# Altium footprint library CeleronLib_THD.PcbLib: 217 footprints (part 1 of 14)
Each footprint in its own frame and in the unit in brackets; x right, y up, seen from the top. Pads: shape width x height; smd on the part's side, far side on the other; paste and mask are expansions set on the pad; w line width, h text height; cw(c..) or ccw(c..) is an arc to the next point about the centre after c.
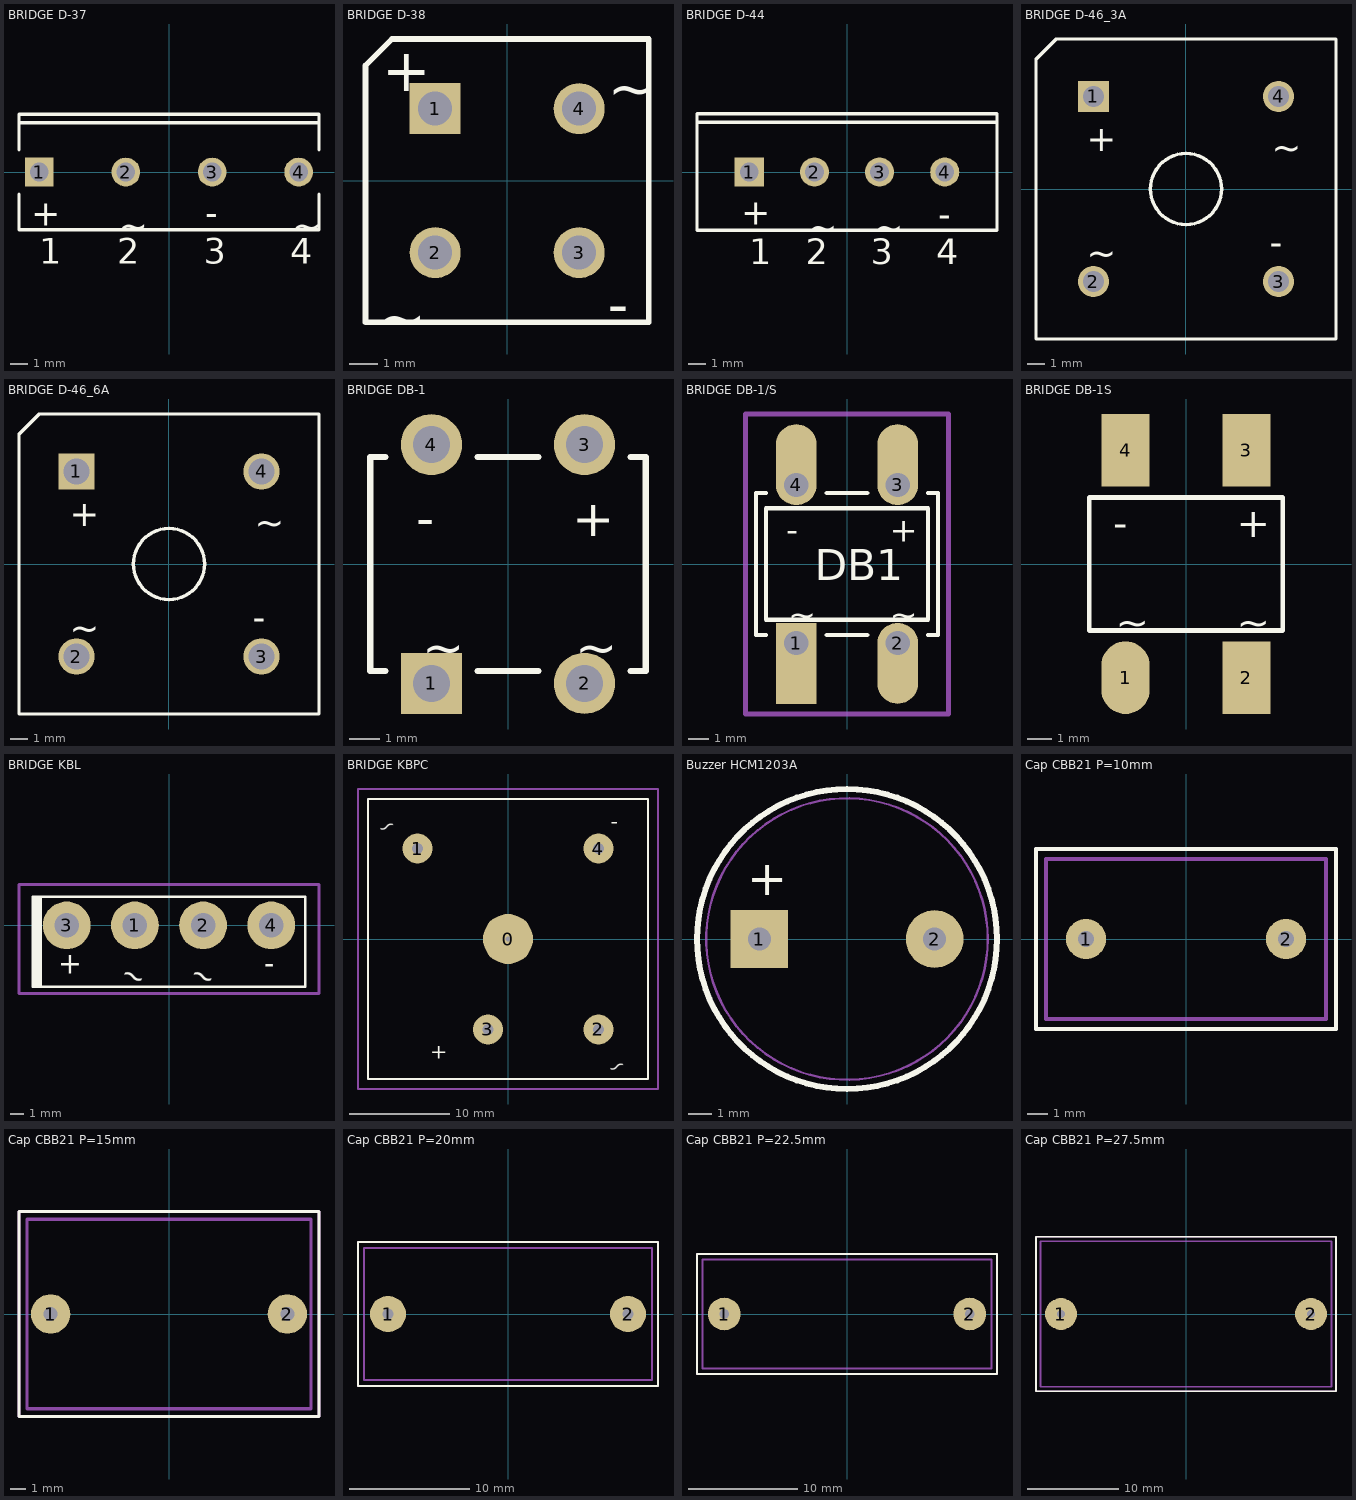
[diagram p0: the footprints below, top view; thin cyan lines are the x and y axes]

## BRIDGE D-37 [mm] "SIP; 4 Leads; Body 15 x 17.5 x 6.8 mm (typ); Pitch 5.1 mm"
height 15
pads (4):
  rect 1.7x1.7 hole 1.1: 1(-7.65,0)
  round 1.7 hole 1.1: 2(-2.55,0) 3(2.55,0) 4(7.65,0)
Top Overlay:
  lines w0.2: -8.85,-1.3 -8.85,-3.4 8.85,-3.4 8.85,-1.3 ; -8.85,1.3 -8.85,3.4 8.85,3.4 8.85,1.3 ; -8.85,2.9 8.85,2.9
  text "~" at 7.27,-3.9 h1.5
  text "~" at -2.97,-3.9 h1.5
  text "+" at -8.14,-3.16 h1.5
  text "-" at 2.13,-3.15 h1.5
  text "4" at 7.142,-5.4 h1.5
  text "3" at 2.042,-5.4 h1.5
  text "2" at -3.058,-5.4 h1.5
  text "1" at -7.65,-5.4 h1.5

## BRIDGE D-38 [mm] "Bridge Rectifier; 4 Terminals; Body 9.4 x 9.4 mm (typ); Pitch 5.08 mm"
height 9.91
pads (4):
  rect 1.8x1.8 hole 1.2: 1(-2.54,2.54)
  round 1.8 hole 1.2: 2(-2.54,-2.54) 3(2.54,-2.54) 4(2.54,2.54)
Top Overlay:
  lines w0.2: -5,-5 -5,4.064 -4.064,5 5,5 5,-5 -5,-5
  text "+" at -4.41,3.164 h1.5
  text "-" at 3.556,-5.08 h1.5
  text "~" at -4.572,-5.588 h1.5
  text "~" at 3.556,2.54 h1.5

## BRIDGE D-44 [mm] "SIP; 4 Leads; Body 15 x 17.5 x 6.8 mm (typ); Pitch 3.8 mm"
height 15
pads (4):
  rect 1.7x1.7 hole 1.1: 1(-5.7,0)
  round 1.7 hole 1.1: 2(-1.9,0) 3(1.9,0) 4(5.7,0)
Top Overlay:
  lines w0.2: -8.75,2.9 8.75,2.9 ; -8.75,-3.4 -8.75,3.4 8.75,3.4 8.75,-3.4 -8.75,-3.4
  text "4" at 5.192,-5.38 h1.5
  text "3" at 1.392,-5.38 h1.5
  text "2" at -2.408,-5.38 h1.5
  text "1" at -5.7,-5.38 h1.5
  text "~" at -2.27,-3.94 h1.5
  text "~" at 1.6,-3.94 h1.5
  text "+" at -6.18,-3.08 h1.5
  text "-" at 5.32,-3.19 h1.5

## BRIDGE D-46_3A [mm] "Bridge Rectifier; 4 Terminals; Body 16.8 x 16.8 mm (typ); Pitch 10.67 mm"
height 6.35
pads (4):
  rect 1.8x1.8 hole 1.2: 1(-5.335,5.335)
  round 1.8 hole 1.2: 2(-5.335,-5.335) 3(5.335,-5.335) 4(5.335,5.335)
Top Overlay:
  circle w0.2: c0,0 r2.05
  lines w0.2: -8.65,-8.65 -8.65,7.474 -7.474,8.65 8.65,8.65 8.65,-8.65 -8.65,-8.65
  text "+" at -5.723,2.167 h1.5
  text "-" at 4.825,-3.809 h1.5
  text "~" at 4.945,1.659 h1.5
  text "~" at -5.723,-4.437 h1.5

## BRIDGE D-46_6A [mm] "Bridge Rectifier; 4 Terminals; Body 16.8 x 16.8 mm (typ); Pitch 10.67 mm"
height 6.35
pads (4):
  rect 2.1x2.1 hole 1.5: 1(-5.335,5.335)
  round 2.1 hole 1.5: 2(-5.335,-5.335) 3(5.335,-5.335) 4(5.335,5.335)
Top Overlay:
  circle w0.2: c0,0 r2.05
  lines w0.2: -8.65,-8.65 8.65,-8.65 8.65,8.65 -7.474,8.65 -8.65,7.474 -8.65,-8.65
  text "~" at -5.723,-4.437 h1.5
  text "~" at 4.945,1.659 h1.5
  text "-" at 4.825,-3.809 h1.5
  text "+" at -5.723,2.167 h1.5

## BRIDGE DB-1 [mm] "Диодный мост, Diode Bridge 1A, 1000V"
height 5.5
pads (4):
  rect 2x2 hole 1.2: 1(-2.5,-3.9)
  round 2 hole 1.2: 2(2.5,-3.9) 3(2.5,3.9) 4(-2.5,3.9)
Top Overlay:
  lines w0.2: -4,-3.5 -4.5,-3.5 -4.5,3.5 -4,3.5 ; -1,-3.5 1,-3.5 ; -1,3.5 1,3.5 ; 4,-3.5 4.5,-3.5 4.5,3.5 4,3.5
  text "~" at 2.2,-3.3 h1.2
  text "+" at 2.1,0.9 h1.2
  text "-" at -3,0.9 h1.2
  text "~" at -2.8,-3.3 h1.2
3D body: height 5.33, standoff -3.3, extent -3.91,-3.935 3.71,3.935

## BRIDGE DB-1/S [mm] "Диодный мост, Diode Bridge 1A, 1000V"
height 5.5
pads (4):
  rect 2x4 hole 1.2 copper offset 0,-1: 1(-2.5,-3.9)
  oval 2x4 hole 1.2 copper offset 0,-1: 2(2.5,-3.9)
  oval 2x4 hole 1.2 copper offset 0,1: 3(2.5,3.9) 4(-2.5,3.9)
Top Overlay:
  lines w0.2: -4,-3.5 -4.5,-3.5 -4.5,3.5 -4,3.5 ; -1,-3.5 1,-3.5 ; -1,3.5 1,3.5 ; 4,-3.5 4.5,-3.5 4.5,3.5 4,3.5 ; -4,-2.75 -4,2.75 4,2.75 4,-2.75 -4,-2.75
  text "~" at -2.9,-3.1 h1.2
  text "~" at 2.1,-3.1 h1.2
  text "+" at 2.1,1.1 h1.2
  text "-" at -3,1.1 h1.2
  text "DB1" at -1.6,-0.8 h1.52
Top Courtyard:
  lines w0.254: -5,-7.4 -5,7.4 5,7.4 5,-7.4 -5,-7.4
3D body: height 5.5, standoff 0.5, extent -4.25,-3.25 4.25,3.25

## BRIDGE DB-1S [mm] "Диодный мост, Diode Bridge 1A, 1000V, SMD"
height 3.5
pads (4):
  oval 2x3 smd: 1(-2.5,-4.7)
  rect 2x3 smd: 2(2.5,-4.7) 3(2.5,4.7) 4(-2.5,4.7)
Top Overlay:
  lines w0.2: -4,-2.75 -4,2.75 4,2.75 4,-2.75 -4,-2.75
  text "~" at 2.1,-3 h1.2
  text "+" at 2.1,1.1 h1.2
  text "-" at -3,1.1 h1.2
  text "~" at -2.9,-3 h1.2
3D body: height 5.5, standoff 0.5, extent -4.25,-3.25 4.25,3.25

## BRIDGE KBL [mm] "KBL10  6,5mm x 19,5mm,  4A, 1000V"
pads (4):
  round 3.5 hole 1.8: 1(-2.5,0) 2(2.5,0) 3(-7.5,0) 4(7.5,0)
Top Overlay:
  rectangle: -10,-4.5 -9.398,2
  lines w0.2: -9.398,-4.445 -9.398,2.1 ; -10,-4.5 10,-4.5 10,2.1 -10,2.1 -10,-4.5
  text "+" at -8.128,-3.556 h1.52
  text "-" at 7,-3.5 h1.52
  text "~" at 1.397,-3.937 h1.52
  text "~" at -3.683,-3.937 h1.52
Top Courtyard:
  lines w0.2: -11,-5 11,-5 11,3 -11,3 -11,-5

## BRIDGE KBPC [mm] "KBPC3510W  28,4mm x 28,4mm"
pads (5):
  round 5 hole 0.5: 0(0,0)
  round 3 hole 1.07: 1(-9.05,9.05) 2(9.05,-9.05) 3(-2,-9.05)
  round 3 hole 1.1: 4(9.05,9.05)
Top Overlay:
  lines w0.2: -14,-14 14,-14 14,14 -14,14 -14,-14
  text "~" at 12,-13 h1.52
  text "~" at -11,11 h1.52
  text "-" at 11,11 h1.52
  text "+" at -6,-12 h1.52
Top Courtyard:
  lines w0.2: -15,-15 15,-15 15,15 -15,15 -15,-15

## Buzzer HCM1203A [mm] "\"Пищалка\" с генератором: D=12, h=9, d=0.6"
height 9
pads (2):
  rect 2.5x2.5 hole 1: 1(-3.8,0)
  round 2.5 hole 1: 2(3.8,0)
Top Overlay:
  circle w0.254: c0,0 r6.5
  text "+" at -4.318,1.905 h1.52
Top 3D:
  circle w0.1: c0,0 r6.1
3D body: height 9, standoff 6, extent -6.109,-6.109 6.109,6.109
3D body: height 6, standoff 0, extent -6.109,-6.109 6.109,6.109

## Cap CBB21 P=10mm [mm] "Конденсатор плёночный, типа CBB21..."
height 12
pads (2):
  round 2 hole 0.8 unplated: 1(-5,0) 2(5,0)
Top Overlay:
  lines w0.2: -7.5,-4.5 -7.5,4.5 7.5,4.5 7.5,-4.5 -7.5,-4.5
Top 3D:
  circle w0.1: c5,0 r0.3
  circle w0.1: c-5,0 r0.3
  lines w0.2: -7,-4 -7,4 7,4 7,-4 -7,-4
Top Courtyard:
  lines w0.2: -7.5,-4.5 7.5,-4.5 7.5,4.5 -7.5,4.5 -7.5,-4.5
3D body: height 12, standoff 1, extent -6.999,-3.999 6.999,3.999
3D body: height 1, standoff -3, extent 4.695,-0.305 5.305,0.305
3D body: height 1, standoff -3, extent -5.305,-0.305 -4.695,0.305

## Cap CBB21 P=15mm [mm] "Конденсатор плёночный, типа CBB21..."
height 17
pads (2):
  round 2.5 hole 0.9 unplated: 1(-7.5,0) 2(7.5,0)
Top Overlay:
  lines w0.2: -9.5,-6.5 -9.5,6.5 9.5,6.5 9.5,-6.5 -9.5,-6.5
Top 3D:
  circle w0.1: c7.5,0 r0.3
  circle w0.1: c-7.5,0 r0.3
  lines w0.2: -9,-6 -9,6 9,6 9,-6 -9,-6
Top Courtyard:
  lines w0.2: -9.5,-6.5 9.5,-6.5 9.5,6.5 -9.5,6.5 -9.5,-6.5
3D body: height 1, standoff -3, extent 7.195,-0.305 7.805,0.305
3D body: height 1, standoff -3, extent -7.805,-0.305 -7.195,0.305
3D body: height 17, standoff 1, extent -8.999,-5.999 8.999,5.999

## Cap CBB21 P=20mm [mm] "Конденсатор плёночный, типа CBB21..."
height 17.5
pads (2):
  round 3 hole 0.9 unplated: 1(-10,0) 2(10,0)
Top Overlay:
  lines w0.2: -12.5,-6 12.5,-6 12.5,6 -12.5,6 -12.5,-6
Top 3D:
  circle w0.1: c-10,0 r0.3
  circle w0.1: c10,0 r0.3
  lines w0.2: -12,-5.5 12,-5.5 12,5.5 -12,5.5 -12,-5.5
Top Courtyard:
  lines w0.2: -12.5,-6 -12.5,6 12.5,6 12.5,-6 -12.5,-6
3D body: height 1, standoff -3, extent -10.311,-0.305 -9.7,0.305
3D body: height 1, standoff -3, extent 9.689,-0.305 10.3,0.305
3D body: height 17.5, standoff 1, extent -11.999,-5.499 11.999,5.499

## Cap CBB21 P=22.5mm [mm] "Конденсатор плёночный, типа CBB21..."
height 19
pads (2):
  round 3 hole 0.9 unplated: 1(-11.25,0) 2(11.25,0)
Top Overlay:
  lines w0.2: -13.75,-5.5 13.75,-5.5 13.75,5.5 -13.75,5.5 -13.75,-5.5
Top 3D:
  circle w0.1: c-11.25,0 r0.3
  circle w0.1: c11.25,0 r0.3
  lines w0.2: -13.25,-5 13.25,-5 13.25,5 -13.25,5 -13.25,-5
Top Courtyard:
  lines w0.2: -13.75,-5.5 -13.75,5.5 13.75,5.5 13.75,-5.5 -13.75,-5.5
3D body: height 19, standoff 1, extent -13.249,-4.999 13.249,4.999
3D body: height 1, standoff -3, extent -11.555,-0.305 -10.945,0.305
3D body: height 1, standoff -3, extent 10.945,-0.305 11.555,0.305

## Cap CBB21 P=27.5mm [mm] "Конденсатор плёночный, типа CBB21..."
height 24
pads (2):
  round 3.5 hole 0.9 unplated: 1(-13.75,0) 2(13.75,0)
Top Overlay:
  lines w0.2: -16.5,-8.5 16.5,-8.5 16.5,8.5 -16.5,8.5 -16.5,-8.5
Top 3D:
  circle w0.1: c-13.75,0 r0.3
  circle w0.1: c13.75,0 r0.3
  lines w0.2: -16,-8 16,-8 16,8 -16,8 -16,-8
Top Courtyard:
  lines w0.2: -16.5,-8.5 -16.5,8.5 16.5,8.5 16.5,-8.5 -16.5,-8.5
3D body: height 1, standoff -3, extent -14.055,-0.305 -13.445,0.305
3D body: height 1, standoff -3, extent 13.445,-0.305 14.055,0.305
3D body: height 24, standoff 1, extent -15.999,-7.999 15.999,7.999